# Altium footprint library TranDangKhoa-LIB.PcbLib: 1435 footprints (part 3 of 90)
Each footprint in its own frame and in the unit in brackets; x right, y up, seen from the top. Pads: shape width x height; smd on the part's side, far side on the other; paste and mask are expansions set on the pad; w line width, h text height; cw(c..) or ccw(c..) is an arc to the next point about the centre after c.
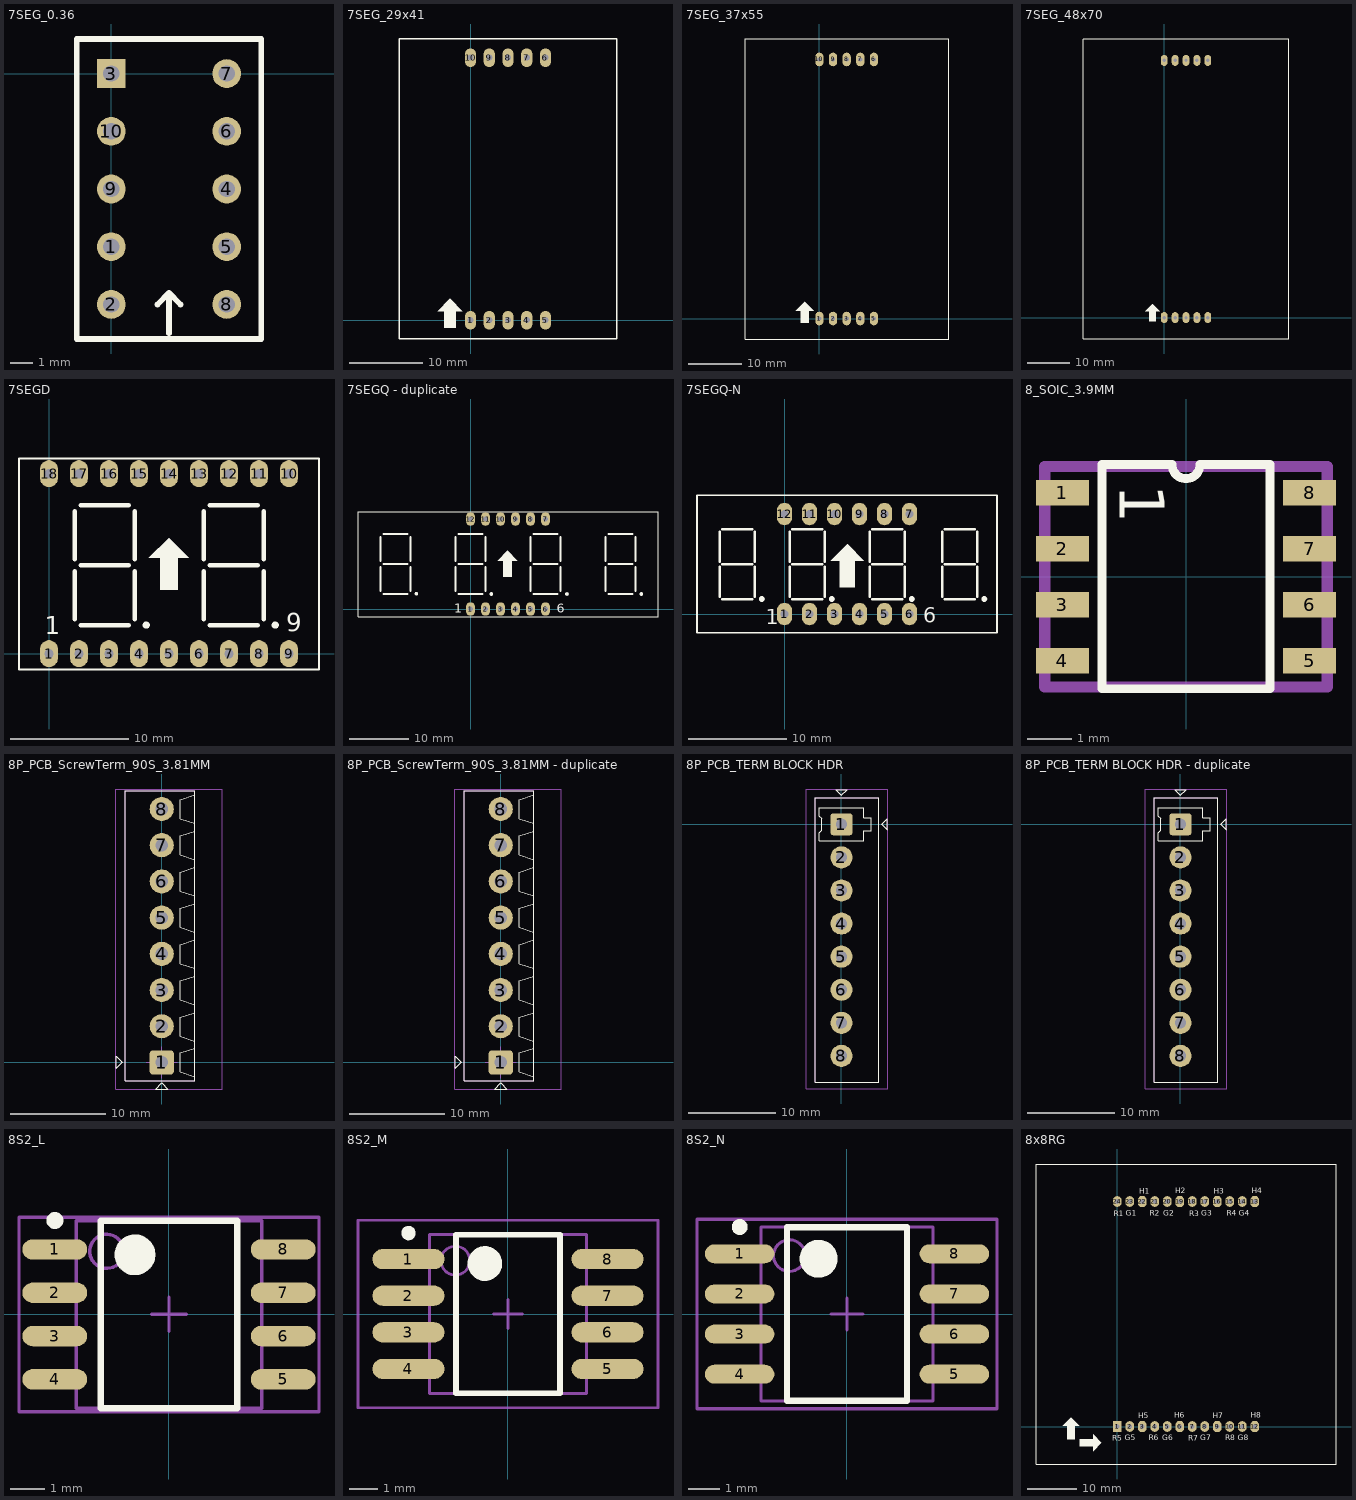
[diagram p2: the footprints below, top view; thin cyan lines are the x and y axes]

## 7SEG_0.36 [mil] "led 7 - 0.36 - 10 pin"
height 314.96
pads (10):
  round 50 hole 28: 1(0,-300) 2(0,-400) 4(200,-200) 5(200,-300) 6(200,-100) 7(200,0) 8(200,-400) 9(0,-200) 10(0,-100)
  rect 50x50 hole 28: 3(0,0)
Top Overlay:
  lines w10: 80,-400 100,-380 ; 100,-450 100,-380 ; 120,-400 100,-380 ; -60,-460 260,-460 260,60 -60,60 -60,-460

## 7SEG_29x41 [mil] "DIP 10 Leads; Body 29 x 41 mm; Pitch 0.5 mm"
height 300
pads (10):
  oval 60x100 hole 32: 1(0,0) 2(100,0) 3(200,0) 4(300,0) 5(400,0) 6(400,1400) 7(300,1400) 8(200,1400) 9(100,1400) 10(0,1400)
Top Overlay:
  region: -176,48 -110,114 -108,114 -43,49 -43,48 -80,48 -80,-40 -139,-40 -139,48
  lines w7: -380,-100 780,-100 780,1500 -380,1500 -380,-100

## 7SEG_37x55 [mil] "DIP 10 Leads; Body 29 x 41 mm; Pitch 0.5 mm"
height 300
pads (10):
  oval 60x100 hole 32: 1(0,0) 2(100,0) 3(200,0) 4(300,0) 5(400,0) 6(400,1900) 7(300,1900) 8(200,1900) 9(100,1900) 10(0,1900)
Top Overlay:
  region: -174,56 -108,122 -106,122 -41,57 -41,56 -78,56 -78,-32 -137,-32 -137,56
  lines w7: -545,-150 950,-150 950,2050 -545,2050 -545,-150

## 7SEG_48x70 [mm] "DIP 10 Leads; Body 47,76 x 70mm; Pitch 0.5 mm"
height 7.62
pads (10):
  oval 1.6x2.54 hole 0.813: 1(0,0) 2(2.54,0) 3(5.08,0) 4(7.62,0) 5(10.16,0) 6(10.16,60) 7(7.62,60) 8(5.08,60) 9(2.54,60) 10(0,60)
Top Overlay:
  region: -4.42,1.422 -2.743,3.099 -2.692,3.099 -1.041,1.448 -1.041,1.422 -1.981,1.422 -1.981,-0.813 -3.48,-0.813 -3.48,1.422
  lines w0.178: -18.92,65 29.08,65 ; -18.92,-5 29.08,-5 -18.92,-5
  lines w0.203: -18.923,-4.928 -18.923,64.999 ; 29.058,-4.928 29.058,64.999

## 7SEGD [mil] "DIP 18 Leads; Body 24 x 15 mm; Pitch 0.5 mm"
height 300
pads (18):
  oval 60x90 hole 31 paste-99999: 1(0,0) 2(100,0) 3(200,0) 5(400,0) 6(500,0) 7(600,0) 8(700,0) 9(800,0) 10(800,600) 11(700,600) 12(600,600) 13(500,600) 14(400,600) 15(300,600) 16(200,600) 17(100,600) 18(0,600)
  oval 60x90 hole 31: 4(300,0)
Top Overlay:
  circle w12: c754,95 r6
  circle w12: c324,95 r6
  region: 333,319 399,385 401,385 466,320 466,319 429,319 429,213 370,213 370,319
  lines w7: -100,-52.5 -100,650 ; -100,-52.5 -100,650 ; -100,-52.5 -100,650 ; -100,-52.5 -100,650 ; -100,650 900,650 ; -100,650 900,650 ; -100,650 900,650 ; -100,650 900,650 ; 900,-52.5 -100,-52 900,-52.5 ; 900,-52.5 900,650 ; 900,-52.5 900,650 ; 900,-52.5 900,650 ; 900,-52.5 900,650
  lines w15: 85,115 85,275 ; 85,115 85,275 ; 85,115 85,275 ; 85,115 85,275 ; 85,115 85,275 ; 85,115 85,275 ; 85,115 85,275 ; 85,115 85,275 ; 85,315 85,475 ; 85,315 85,475 ; 85,315 85,475 ; 85,315 85,475 ; 85,315 85,475 ; 85,315 85,475 ; 85,315 85,475 ; 85,315 85,475 ; 105,95 265,95 ; 105,95 265,95 ; 105,95 265,95 ; 105,95 265,95 ; 105,295 265,295 ; 105,295 265,295 ; 105,295 265,295 ; 105,295 265,295 ; 105,295 265,295 ; 105,295 265,295 ; 105,295 265,295 ; 105,295 265,295 ; 105,495 265,495 ; 105,495 265,495 ; 105,495 265,495 ; 105,495 265,495 ; 285,115 285,275 ; 285,115 285,275 ; 285,115 285,275 ; 285,115 285,275 ; 285,115 285,275 ; 285,115 285,275 ; 285,115 285,275 ; 285,115 285,275 ; 285,315 285,475 ; 285,315 285,475 ; 285,315 285,475 ; 285,315 285,475 ; 285,315 285,475 ; 285,315 285,475 ; 285,315 285,475 ; 285,315 285,475 ; 515,115 515,275 ; 515,115 515,275 ; 515,115 515,275 ; 515,115 515,275 ; 515,115 515,275 ; 515,115 515,275 ; 515,115 515,275 ; 515,115 515,275 ; 515,315 515,475 ; 515,315 515,475 ; 515,315 515,475 ; 515,315 515,475 ; 515,315 515,475 ; 515,315 515,475 ; 515,315 515,475 ; 515,315 515,475 ; 535,95 695,95 ; 535,95 695,95 ; 535,95 695,95 ; 535,95 695,95 ; 535,295 695,295 ; 535,295 695,295 ; 535,295 695,295 ; 535,295 695,295 ; 535,295 695,295 ; 535,295 695,295 ; 535,295 695,295 ; 535,295 695,295 ; 535,495 695,495 ; 535,495 695,495 ; 535,495 695,495 ; 535,495 695,495 ; 715,115 715,275 ; 715,115 715,275 ; 715,115 715,275 ; 715,115 715,275 ; 715,115 715,275 ; 715,115 715,275 ; 715,115 715,275 ; 715,115 715,275 ; 715,315 715,475 ; 715,315 715,475 ; 715,315 715,475 ; 715,315 715,475 ; 715,315 715,475 ; 715,315 715,475 ; 715,315 715,475 ; 715,315 715,475
  text "1" at -14,65 h60
  text "9" at 790,75 h60

## 7SEGQ - duplicate [mil] "DIP 12 Leads; Body 48 x 20 mm; Pitch 0.5 mm"
height 300
pads (12):
  oval 60x90 hole 31: 1(0,0) 2(100,0) 3(200,0) 4(300,0) 5(400,0) 6(500,0) 7(500,600) 8(400,600) 9(300,600) 10(200,600) 11(100,600) 12(0,600)
Top Overlay:
  drawing of 155 lines, arcs and shapes, not listed
  text "1" at -108,-24 h60
  text "6" at 575,-26 h60
3D body "7seg2-4.STEP": height 564.96, standoff 112.2, extent -720.16,-80 1260.16,668.03
3D body "SOCKET6.stp": height 276.19, standoff -117.51, extent -50,-44.99 550,55.01
3D body "SOCKET6.stp": height 276.19, standoff -117.51, extent -50,550 550,650

## 7SEGQ-N [mil] "DIP 12 Leads; Body 32x 15 mm; Pitch 0.5 mm"
height 300
pads (12):
  oval 60x90 hole 31: 1(0,0) 2(100,0) 3(200,0) 4(300,0) 5(400,0) 6(500,0) 7(500,400) 8(400,400) 9(300,400) 10(200,400) 11(100,400) 12(0,400)
Top Overlay:
  circle w12: c189,60 r6
  circle w12: c-91,60 r6
  circle w12: c799,60 r6
  circle w12: c509,60 r6
  region: 184,213 250,279 252,279 317,214 317,213 280,213 280,107 221,107 221,213
  lines w7: -350,-75 850,-75 850,475 -350,475 -350,-75
  lines w10: -260,70 -260,190 ; -260,210 -260,330 ; -250,60 -130,60 ; -250,340 -130,340 ; -120,70 -120,190 ; -120,210 -120,330 ; 20,70 20,190 ; 20,210 20,330 ; 30,60 150,60 ; 30,340 150,340 ; 160,70 160,190 ; 160,210 160,330 ; 340,70 340,190 ; 340,210 340,330 ; 350,60 470,60 ; 350,340 470,340 ; 480,70 480,190 ; 480,210 480,330 ; 630,70 630,190 ; 630,210 630,330 ; 640,60 760,60 ; 640,340 760,340 ; 770,70 770,190 ; 770,210 770,330 ; -250,200 -130,200 -250,200 ; 30,200 150,200 30,200 ; 350,200 470,200 350,200 ; 640,200 760,200 640,200
  text "6" at 555,-35 h60
  text "1" at -75,-40 h60
3D body "SW3dPS-LTC-3710HR DISPLAY, 4-LED.STEP": height 238, standoff -98, extent -335.5,-70 865.5,450

## 8_SOIC_3.9MM [mm]
pads (8):
  rect 1.2x0.58 smd: 1(-2.8,1.905) 2(-2.8,0.635) 3(-2.8,-0.635) 4(-2.8,-1.905) 5(2.8,-1.905) 6(2.8,-0.635) 7(2.8,0.635) 8(2.8,1.905)
Top Overlay:
  lines w0.2: -1.905,-2.54 1.905,-2.54 1.905,2.54 0.318,2.54 cw(c0,2.54) -0.318,2.54 -1.905,2.54 -1.905,-2.54
  text "1" at -1.5,2.1 h1.02
Mechanical 16:
  circle w0.254: c-2.7,1.9 r0.1
  lines w0.254: -3.2,-2.5 -3.2,2.5 3.2,2.5 3.2,-2.5 -3.2,-2.5
Mechanical 29:
  text ".Designator" at 1.9,0.8 h1.52
3D body "SOIC-8-1.step": height 1.75, standoff 0, extent -3,-2.45 3,2.45

## 8P_PCB_ScrewTerm_90S_3.81MM [mil] "TERM BLOCK 8POS SIDE ENT STACKABLE 3.81MM"
height 334.65
pads (8):
  rrect25% 100x100 hole 52: 1(0,0)
  round 100 hole 52: 2(0,150) 3(0,300) 4(0,450) 5(0,600) 6(0,750) 7(0,900) 8(0,1050)
Top Overlay:
  lines w5: 135.83,-59.06 76.78,-39.37 76.78,39.37 135.83,59.06 ; 135.83,88.58 76.78,108.27 76.78,187.01 135.83,206.69 ; 135.83,240 76.78,259.69 76.78,338.43 135.83,358.11 ; 135.83,390 76.78,409.69 76.78,488.43 135.83,508.11 ; 135.83,540 76.78,559.68 76.78,638.43 135.83,658.11 ; 135.83,690 76.78,709.68 76.78,788.43 135.83,808.11 ; 135.83,840 76.78,859.68 76.78,938.43 135.83,958.11 ; 135.83,990 76.78,1009.68 76.78,1088.43 135.83,1108.11 ; -188,-25 -188,25 -163,0 -188,-25 ; -151.57,-75 135.83,-75 135.83,1125 -151.57,1125 -151.57,-75 ; -25,-110 0,-85 25,-110 -25,-110
Mechanical 13:
  lines w3: -151.57,-75 -151.57,1125 135.83,1125 135.83,-75 -151.57,-75
Mechanical 15:
  lines w3: -65,0 65,0 ; 0,-65 0,65 ; -190,-110 250,-110 250,1132.88 -190,1132.88 -190,-110
3D body "c-1776113-8-o-3d.stp": height 335.25, standoff -137.2, extent -151.56,-75 135.84,1125

## 8P_PCB_ScrewTerm_90S_3.81MM - duplicate [mil] "TERM BLOCK 8POS SIDE ENT STACKABLE 3.81MM"
height 334.65
pads (8):
  rrect25% 100x100 hole 52: 1(0,0)
  round 100 hole 52: 2(0,150) 3(0,300) 4(0,450) 5(0,600) 6(0,750) 7(0,900) 8(0,1050)
Top Overlay:
  lines w5: 135.83,-59.06 76.78,-39.37 76.78,39.37 135.83,59.06 ; 135.83,88.58 76.78,108.27 76.78,187.01 135.83,206.69 ; 135.83,240 76.78,259.69 76.78,338.43 135.83,358.11 ; 135.83,390 76.78,409.69 76.78,488.43 135.83,508.11 ; 135.83,540 76.78,559.68 76.78,638.43 135.83,658.11 ; 135.83,690 76.78,709.68 76.78,788.43 135.83,808.11 ; 135.83,840 76.78,859.68 76.78,938.43 135.83,958.11 ; 135.83,990 76.78,1009.68 76.78,1088.43 135.83,1108.11 ; -188,-25 -188,25 -163,0 -188,-25 ; -151.57,-75 135.83,-75 135.83,1125 -151.57,1125 -151.57,-75 ; -25,-110 0,-85 25,-110 -25,-110
Mechanical 13:
  lines w3: -151.57,-75 -151.57,1125 135.83,1125 135.83,-75 -151.57,-75
Mechanical 15:
  lines w3: -65,0 65,0 ; 0,-65 0,65 ; -190,-110 250,-110 250,1132.88 -190,1132.88 -190,-110
3D body "c-1776113-8-o-3d.stp": height 335.25, standoff -137.2, extent -151.57,-75 135.83,1125

## 8P_PCB_TERM BLOCK HDR [mil] "TERM BLOCK HDR 8POS 3.81MM"
height 362.2
pads (8):
  rrect25% 100x100 hole 52: 1(0,0)
  round 100 hole 52: 2(0,-150) 3(0,-300) 4(0,-450) 5(0,-600) 6(0,-750) 7(0,-900) 8(0,-1050)
Top Overlay:
  lines w5: -120,-1170 170,-1170 170,120 -120,120 -120,-1170 ; -100,-75 100,-75 100,-30 135,-30 135,30 100,30 100,75 -100,75 -100,37.5 -90,27.5 -90,-27.5 -100,-37.5 -100,-75 ; -25,157 0,132 25,157 -25,157 ; 182,0 207,25 207,-25 182,0
Mechanical 13:
  lines w3: -120,-1170 -120,120 170,120 170,-1170 -120,-1170
Mechanical 15:
  lines w3: -160,-1200 210,-1200 210,160 -160,160 -160,-1200
3D body "c-0284517-08-c-3d.stp": height 362.8, standoff -133.26, extent -118.11,-1170.07 167.33,120.08
3D body: height 362.2, standoff 0, extent -120,-1170 170,120

## 8P_PCB_TERM BLOCK HDR - duplicate [mil] "TERM BLOCK HDR 8POS 3.81MM"
height 362.2
pads (8):
  rrect25% 100x100 hole 52: 1(0,0)
  round 100 hole 52: 2(0,-150) 3(0,-300) 4(0,-450) 5(0,-600) 6(0,-750) 7(0,-900) 8(0,-1050)
Top Overlay:
  lines w5: -120,-1170 170,-1170 170,120 -120,120 -120,-1170 ; -100,-75 100,-75 100,-30 135,-30 135,30 100,30 100,75 -100,75 -100,37.5 -90,27.5 -90,-27.5 -100,-37.5 -100,-75 ; -25,157 0,132 25,157 -25,157 ; 182,0 207,25 207,-25 182,0
Mechanical 13:
  lines w3: -120,-1170 -120,120 170,120 170,-1170 -120,-1170
Mechanical 15:
  lines w3: -160,-1200 210,-1200 210,160 -160,160 -160,-1200
3D body "c-0284517-08-c-3d.stp": height 362.8, standoff -133.26, extent -118.11,-1170.07 167.33,120.08
3D body: height 362.2, standoff 0, extent -120,-1170 170,120

## 8S2_L [mm] "SOP, 8-Leads, Body 5.3x5.3mm, Pitch 1.27mm, IPC High Density"
height 2.03
pads (8):
  oval 1.9x0.6 smd: 1(-3.35,1.905) 2(-3.35,0.635) 3(-3.35,-0.635) 4(-3.35,-1.905) 5(3.35,-1.905) 6(3.35,-0.635) 7(3.35,0.635) 8(3.35,1.905)
Top Overlay:
  circle w0.6: c-1,1.75 r0.3
  circle w0.25: c-3.35,2.755 r0.125
  lines w0.2: -2,-2.75 2,-2.75 2,2.75 -2,2.75 -2,-2.75
Mechanical 13:
  circle w0.1: c-1.825,1.85 r0.5
  lines w0.1: -2.725,-2.75 2.725,-2.75 2.725,2.75 -2.725,2.75 -2.725,-2.75
Mechanical 15:
  lines w0.1: -0.5,0 0.5,0 ; 0,-0.5 0,0.5 ; -4.4,-2.85 4.4,-2.85 4.4,2.85 -4.4,2.85 -4.4,-2.85

## 8S2_M [mm] "SOP, 8-Leads, Body 5.3x5.3mm, Pitch 1.27mm, IPC Low Density"
height 2.03
pads (8):
  oval 2.5x0.7 smd: 1(-3.45,1.905) 2(-3.45,0.635) 3(-3.45,-0.635) 4(-3.45,-1.905) 5(3.45,-1.905) 6(3.45,-0.635) 7(3.45,0.635) 8(3.45,1.905)
Top Overlay:
  circle w0.25: c-3.45,2.805 r0.125
  circle w0.6: c-0.8,1.75 r0.3
  lines w0.2: -1.8,-2.75 -1.8,2.75 1.8,2.75 1.8,-2.75 -1.8,-2.75
Mechanical 13:
  circle w0.1: c-1.825,1.85 r0.5
  lines w0.1: -2.725,-2.75 -2.725,2.75 2.725,2.75 2.725,-2.75 -2.725,-2.75
Mechanical 15:
  lines w0.1: -0.5,0 0.5,0 ; 0,-0.5 0,0.5 ; -5.2,-3.25 -5.2,3.25 5.2,3.25 5.2,-3.25 -5.2,-3.25

## 8S2_N [mm] "SOP, 8-Leads, Body 5.3x5.3mm, Pitch 1.27mm, IPC Medium Density"
height 2.03
pads (8):
  oval 2.2x0.6 smd: 1(-3.4,1.905) 2(-3.4,0.635) 3(-3.4,-0.635) 4(-3.4,-1.905) 5(3.4,-1.905) 6(3.4,-0.635) 7(3.4,0.635) 8(3.4,1.905)
Top Overlay:
  circle w0.25: c-3.4,2.755 r0.125
  circle w0.6: c-0.9,1.75 r0.3
  lines w0.2: -1.9,-2.75 -1.9,2.75 1.9,2.75 1.9,-2.75 -1.9,-2.75
Mechanical 13:
  circle w0.1: c-1.825,1.85 r0.5
  lines w0.1: -2.725,-2.75 -2.725,2.75 2.725,2.75 2.725,-2.75 -2.725,-2.75
Mechanical 15:
  lines w0.1: -0.5,0 0.5,0 ; 0,-0.5 0,0.5 ; -4.75,-3 -4.75,3 4.75,3 4.75,-3 -4.75,-3

## 8x8RG [mil] "Matran 8x8 2mau,Body 60 X 60mm"
height 300
pads (24):
  rect 70x85 hole 37.4: 1(0,0)
  oval 70x85 hole 37.4: 2(100,0) 4(300,0) 5(400,0) 7(600,0) 8(700,0) 10(900,0) 11(1000,0) 14(1000,1800) 15(900,1800) 17(700,1800) 18(600,1800) 20(400,1800) 21(300,1800) 23(100,1800) 24(0,1800)
  oct 70x85 hole 37.4: 3(200,0) 6(500,0) 9(800,0) 12(1100,0) 13(1100,1800) 16(800,1800) 19(500,1800) 22(200,1800)
Top Overlay:
  region: -193,-63 -127,-129 -127,-131 -192,-196 -193,-196 -193,-159 -299,-159 -299,-100 -193,-100
  region: -437,5 -371,71 -369,71 -304,6 -304,5 -341,5 -341,-101 -400,-101 -400,5
  lines w7: -650,-300 -650,2100 ; -650,-300 -650,2100 ; -650,-300 1750,-300 ; -650,2100 1750,2100 ; 1750,-300 1750,2100 ; 1750,-300 1750,2100
  text "R4" at 874,1685 h45
  text "G4" at 970,1686 h45
  text "H4" at 1076,1865 h45
  text "R3" at 576,1684 h45
  text "G3" at 672,1685 h45
  text "H3" at 773,1864 h45
  text "R2" at 258,1685 h45
  text "G2" at 366,1685 h45
  text "H2" at 464,1865 h45
  text "H1" at 174,1864 h45
  text "G1" at 68,1685 h45
  text "R1" at -28,1684 h45
  text "R5" at -40,-112 h45
  text "G5" at 60,-111 h45
  text "H5" at 166,68 h45
  text "H6" at 456,69 h45
  text "G6" at 358,-111 h45
  text "R6" at 250,-111 h45
  text "H7" at 765,68 h45
  text "G7" at 664,-111 h45
  text "R7" at 568,-112 h45
  text "H8" at 1068,69 h45
  text "G8" at 962,-110 h45
  text "R8" at 863,-111 h45
Bottom Overlay:
  text "R4" at 943,1685 h45
  text "G4" at 1039,1686 h45
  text "H4" at 1145,1865 h45
  text "R3" at 645,1684 h45
  text "G3" at 741,1685 h45
  text "H3" at 842,1864 h45
  text "R2" at 327,1685 h45
  text "G2" at 435,1685 h45
  text "H2" at 533,1865 h45
  text "H1" at 243,1864 h45
  text "G1" at 137,1685 h45
  text "R1" at 41,1684 h45
  text "R5" at 29,-112 h45
  text "G5" at 129,-111 h45
  text "H5" at 235,68 h45
  text "H6" at 525,69 h45
  text "G6" at 427,-111 h45
  text "R6" at 319,-111 h45
  text "H7" at 834,68 h45
  text "G7" at 733,-111 h45
  text "R7" at 637,-112 h45
  text "H8" at 1137,69 h45
  text "G8" at 1031,-110 h45
  text "R8" at 932,-111 h45